# Altium integrated library Samtec 2,54 mm Pitch Socket Strips.IntLib: 489 symbols (part 2 of 4) (continued)
## SMH-104-02-G-D (continued)
SMT Horizontal Socket, -55 to 125 degC, 2.54 mm Pitch, 8-Pin, Female, RoHS; Manufacturer: Samtec; PartNumber: SMH-104-02-G-D; Pitch: 2.54 mm; DatasheetVersion: F-214; PackageVersion: AF, 2/1999; PackageReference: SMH-104-02-X-D; PackageDescription: .100 [2.54] Horizontal SMT Socket Assembly; Supplier 1: Newark; Supplier Part Number 1: 97P7854; Orientation: Horizontal; RoHS: True; Temperature Range: -55 to 125 degC; Mounting Technology: Surface Mount; ComponentLink1Description: Manufacturer URL; ComponentLink1URL: http://www.samtec.com; ComponentLink2Description: Datasheet; ComponentLink2URL: http://www.samtec.com/documents/webfiles/pdf/SMH.PDF; ComponentLink3Description: Package Specification; ComponentLink3URL: http://www.samtec.com/documents/webfiles/cpdf/SMH-1XX-XX-XX-X-XX-MKT.pdf
footprint SMTC-SMH-104-02-X-D (Horizontal SMT Socket Assembly, 2x4 Pins, 2.54mm Pitch, Female)
pins: 1, 2, 3, 4, 5, 6, 7, 8

## SMH-104-02-L-D
designator J?
SMT Horizontal Socket, -55 to 125 degC, 2.54 mm Pitch, 8-Pin, Female, RoHS; Manufacturer: Samtec; PartNumber: SMH-104-02-L-D; Pitch: 2.54 mm; DatasheetVersion: F-214; PackageVersion: AF, 2/1999; PackageReference: SMH-104-02-X-D; PackageDescription: .100 [2.54] Horizontal SMT Socket Assembly; Orientation: Horizontal; RoHS: True; Temperature Range: -55 to 125 degC; Mounting Technology: Surface Mount; ComponentLink1Description: Manufacturer URL; ComponentLink1URL: http://www.samtec.com; ComponentLink2Description: Datasheet; ComponentLink2URL: http://www.samtec.com/documents/webfiles/pdf/SMH.PDF; ComponentLink3Description: Package Specification; ComponentLink3URL: http://www.samtec.com/documents/webfiles/cpdf/SMH-1XX-XX-XX-X-XX-MKT.pdf
footprint SMTC-SMH-104-02-X-D (Horizontal SMT Socket Assembly, 2x4 Pins, 2.54mm Pitch, Female)
pins: 1, 2, 3, 4, 5, 6, 7, 8

## SMH-104-02-T-D
designator J?
SMT Horizontal Socket, -55 to 105 degC, 2.54 mm Pitch, 8-Pin, Female, RoHS; Manufacturer: Samtec; PartNumber: SMH-104-02-T-D; Pitch: 2.54 mm; DatasheetVersion: F-214; PackageVersion: AF, 2/1999; PackageReference: SMH-104-02-X-D; PackageDescription: .100 [2.54] Horizontal SMT Socket Assembly; Supplier 1: Newark; Supplier Part Number 1: 97P7867; Orientation: Horizontal; RoHS: True; Temperature Range: -55 to 105 degC; Mounting Technology: Surface Mount; ComponentLink1Description: Manufacturer URL; ComponentLink1URL: http://www.samtec.com; ComponentLink2Description: Datasheet; ComponentLink2URL: http://www.samtec.com/documents/webfiles/pdf/SMH.PDF; ComponentLink3Description: Package Specification; ComponentLink3URL: http://www.samtec.com/documents/webfiles/cpdf/SMH-1XX-XX-XX-X-XX-MKT.pdf
footprint SMTC-SMH-104-02-X-D (Horizontal SMT Socket Assembly, 2x4 Pins, 2.54mm Pitch, Female)
pins: 1, 2, 3, 4, 5, 6, 7, 8

## SMH-105-02-G-D
designator J?
SMT Horizontal Socket, -55 to 125 degC, 2.54 mm Pitch, 10-Pin, Female, RoHS; Manufacturer: Samtec; PartNumber: SMH-105-02-G-D; Pitch: 2.54 mm; DatasheetVersion: F-214; PackageVersion: AF, 2/1999; PackageReference: SMH-105-02-X-D; PackageDescription: .100 [2.54] Horizontal SMT Socket Assembly; Supplier 1: Newark; Supplier Part Number 1: 97P7877; Orientation: Horizontal; RoHS: True; Temperature Range: -55 to 125 degC; Mounting Technology: Surface Mount; ComponentLink1Description: Manufacturer URL; ComponentLink1URL: http://www.samtec.com; ComponentLink2Description: Datasheet; ComponentLink2URL: http://www.samtec.com/documents/webfiles/pdf/SMH.PDF; ComponentLink3Description: Package Specification; ComponentLink3URL: http://www.samtec.com/documents/webfiles/cpdf/SMH-1XX-XX-XX-X-XX-MKT.pdf
footprint SMTC-SMH-105-02-X-D (Horizontal SMT Socket Assembly, 2x5 Pins, 2.54mm Pitch, Female)
pins: 1, 2, 3, 4, 5, 6, 7, 8, 9, 10

## SMH-105-02-G-D-01
designator J?
SMT Horizontal Socket, -55 to 125 degC, 2.54 mm Pitch, 10-Pin, Female, RoHS; Manufacturer: Samtec; PartNumber: SMH-105-02-G-D-01; Pitch: 2.54 mm; DatasheetVersion: F-214; PackageVersion: AF, 2/1999; PackageReference: SMH-105-02-X-D-01; PackageDescription: .100 [2.54] Horizontal SMT Socket Assembly; Orientation: Horizontal; RoHS: True; Temperature Range: -55 to 125 degC; Mounting Technology: Surface Mount; ComponentLink1Description: Manufacturer URL; ComponentLink1URL: http://www.samtec.com; ComponentLink2Description: Datasheet; ComponentLink2URL: http://www.samtec.com/documents/webfiles/pdf/SMH.PDF; ComponentLink3Description: Package Specification; ComponentLink3URL: http://www.samtec.com/documents/webfiles/cpdf/SMH-1XX-XX-XX-X-XX-MKT.pdf
footprint SMTC-SMH-105-02-X-D-01 (Horizontal SMT Socket Assembly, 2x5 Pins, 2.54mm Pitch, Female)
pins: 1, 2, 3, 4, 5, 6, 7, 8, 9, 10

## SMH-105-02-G-D-BASIC
designator J?
SMT Horizontal Socket, -55 to 125 degC, 2.54 mm Pitch, 10-Pin, Female, RoHS; Manufacturer: Samtec; PartNumber: SMH-105-02-G-D-BASIC; Pitch: 2.54 mm; DatasheetVersion: F-214; PackageVersion: AF, 2/1999; PackageReference: SMH-105-02-X-D-BASIC; PackageDescription: .100 [2.54] Horizontal SMT Socket Assembly; Orientation: Horizontal; RoHS: True; Temperature Range: -55 to 125 degC; Mounting Technology: Surface Mount; ComponentLink1Description: Manufacturer URL; ComponentLink1URL: http://www.samtec.com; ComponentLink2Description: Datasheet; ComponentLink2URL: http://www.samtec.com/documents/webfiles/pdf/SMH.PDF; ComponentLink3Description: Package Specification; ComponentLink3URL: http://www.samtec.com/documents/webfiles/cpdf/SMH-1XX-XX-XX-X-XX-MKT.pdf
footprint SMTC-SMH-105-02-X-D-BASIC (Horizontal SMT Socket Assembly, 2x5 Pins, 2.54mm Pitch, Female)
pins: 1, 2, 3, 4, 5, 6, 7, 8, 9, 10

## SMH-105-02-G-S
designator J?
SMT Horizontal Socket, -55 to 125 degC, 2.54 mm Pitch, 5-Pin, Female, RoHS; Manufacturer: Samtec; PartNumber: SMH-105-02-G-S; Pitch: 2.54 mm; DatasheetVersion: F-214; PackageVersion: AF, 2/1999; PackageReference: SMH-105-02-X-S; PackageDescription: .100 [2.54] Horizontal SMT Socket Assembly; Supplier 1: Newark; Supplier Part Number 1: 97P7883; Orientation: Horizontal; RoHS: True; Temperature Range: -55 to 125 degC; Mounting Technology: Surface Mount; ComponentLink1Description: Manufacturer URL; ComponentLink1URL: http://www.samtec.com; ComponentLink2Description: Datasheet; ComponentLink2URL: http://www.samtec.com/documents/webfiles/pdf/SMH.PDF; ComponentLink3Description: Package Specification; ComponentLink3URL: http://www.samtec.com/documents/webfiles/cpdf/SMH-1XX-XX-XX-X-XX-MKT.pdf
footprint SMTC-SMH-105-02-X-S (Horizontal SMT Socket Assembly, 1x5 Pins, 2.54mm Pitch, Female)
pins: 1, 2, 3, 4, 5

## SMH-105-02-L-D
designator J?
SMT Horizontal Socket, -55 to 125 degC, 2.54 mm Pitch, 10-Pin, Female, RoHS; Manufacturer: Samtec; PartNumber: SMH-105-02-L-D; Pitch: 2.54 mm; DatasheetVersion: F-214; PackageVersion: AF, 2/1999; PackageReference: SMH-105-02-X-D; PackageDescription: .100 [2.54] Horizontal SMT Socket Assembly; Supplier 1: Newark; Supplier Part Number 1: 85T6353; Orientation: Horizontal; RoHS: True; Temperature Range: -55 to 125 degC; Mounting Technology: Surface Mount; ComponentLink1Description: Manufacturer URL; ComponentLink1URL: http://www.samtec.com; ComponentLink2Description: Datasheet; ComponentLink2URL: http://www.samtec.com/documents/webfiles/pdf/SMH.PDF; ComponentLink3Description: Package Specification; ComponentLink3URL: http://www.samtec.com/documents/webfiles/cpdf/SMH-1XX-XX-XX-X-XX-MKT.pdf
footprint SMTC-SMH-105-02-X-D (Horizontal SMT Socket Assembly, 2x5 Pins, 2.54mm Pitch, Female)
pins: 1, 2, 3, 4, 5, 6, 7, 8, 9, 10

## SMH-105-02-L-D-01
designator J?
SMT Horizontal Socket, -55 to 125 degC, 2.54 mm Pitch, 10-Pin, Female, RoHS; Manufacturer: Samtec; PartNumber: SMH-105-02-L-D-01; Pitch: 2.54 mm; DatasheetVersion: F-214; PackageVersion: AF, 2/1999; PackageReference: SMH-105-02-X-D-01; PackageDescription: .100 [2.54] Horizontal SMT Socket Assembly; Orientation: Horizontal; RoHS: True; Temperature Range: -55 to 125 degC; Mounting Technology: Surface Mount; ComponentLink1Description: Manufacturer URL; ComponentLink1URL: http://www.samtec.com; ComponentLink2Description: Datasheet; ComponentLink2URL: http://www.samtec.com/documents/webfiles/pdf/SMH.PDF; ComponentLink3Description: Package Specification; ComponentLink3URL: http://www.samtec.com/documents/webfiles/cpdf/SMH-1XX-XX-XX-X-XX-MKT.pdf
footprint SMTC-SMH-105-02-X-D-01 (Horizontal SMT Socket Assembly, 2x5 Pins, 2.54mm Pitch, Female)
pins: 1, 2, 3, 4, 5, 6, 7, 8, 9, 10

## SMH-105-02-L-D-BASIC
designator J?
SMT Horizontal Socket, -55 to 125 degC, 2.54 mm Pitch, 10-Pin, Female, RoHS; Manufacturer: Samtec; PartNumber: SMH-105-02-L-D-BASIC; Pitch: 2.54 mm; DatasheetVersion: F-214; PackageVersion: AF, 2/1999; PackageReference: SMH-105-02-X-D-BASIC; PackageDescription: .100 [2.54] Horizontal SMT Socket Assembly; Orientation: Horizontal; RoHS: True; Temperature Range: -55 to 125 degC; Mounting Technology: Surface Mount; ComponentLink1Description: Manufacturer URL; ComponentLink1URL: http://www.samtec.com; ComponentLink2Description: Datasheet; ComponentLink2URL: http://www.samtec.com/documents/webfiles/pdf/SMH.PDF; ComponentLink3Description: Package Specification; ComponentLink3URL: http://www.samtec.com/documents/webfiles/cpdf/SMH-1XX-XX-XX-X-XX-MKT.pdf
footprint SMTC-SMH-105-02-X-D-BASIC (Horizontal SMT Socket Assembly, 2x5 Pins, 2.54mm Pitch, Female)
pins: 1, 2, 3, 4, 5, 6, 7, 8, 9, 10

## SMH-105-02-L-S
designator J?
SMT Horizontal Socket, -55 to 125 degC, 2.54 mm Pitch, 5-Pin, Female, RoHS; Manufacturer: Samtec; PartNumber: SMH-105-02-L-S; Pitch: 2.54 mm; DatasheetVersion: F-214; PackageVersion: AF, 2/1999; PackageReference: SMH-105-02-X-S; PackageDescription: .100 [2.54] Horizontal SMT Socket Assembly; Supplier 1: Newark; Supplier Part Number 1: 85T6354; Orientation: Horizontal; RoHS: True; Temperature Range: -55 to 125 degC; Mounting Technology: Surface Mount; ComponentLink1Description: Manufacturer URL; ComponentLink1URL: http://www.samtec.com; ComponentLink2Description: Datasheet; ComponentLink2URL: http://www.samtec.com/documents/webfiles/pdf/SMH.PDF; ComponentLink3Description: Package Specification; ComponentLink3URL: http://www.samtec.com/documents/webfiles/cpdf/SMH-1XX-XX-XX-X-XX-MKT.pdf
footprint SMTC-SMH-105-02-X-S (Horizontal SMT Socket Assembly, 1x5 Pins, 2.54mm Pitch, Female)
pins: 1, 2, 3, 4, 5

## SMH-105-02-T-D
designator J?
SMT Horizontal Socket, -55 to 105 degC, 2.54 mm Pitch, 10-Pin, Female, RoHS; Manufacturer: Samtec; PartNumber: SMH-105-02-T-D; Pitch: 2.54 mm; DatasheetVersion: F-214; PackageVersion: AF, 2/1999; PackageReference: SMH-105-02-X-D; PackageDescription: .100 [2.54] Horizontal SMT Socket Assembly; Supplier 1: Newark; Supplier Part Number 1: 97P7897; Orientation: Horizontal; RoHS: True; Temperature Range: -55 to 105 degC; Mounting Technology: Surface Mount; ComponentLink1Description: Manufacturer URL; ComponentLink1URL: http://www.samtec.com; ComponentLink2Description: Datasheet; ComponentLink2URL: http://www.samtec.com/documents/webfiles/pdf/SMH.PDF; ComponentLink3Description: Package Specification; ComponentLink3URL: http://www.samtec.com/documents/webfiles/cpdf/SMH-1XX-XX-XX-X-XX-MKT.pdf
footprint SMTC-SMH-105-02-X-D (Horizontal SMT Socket Assembly, 2x5 Pins, 2.54mm Pitch, Female)
pins: 1, 2, 3, 4, 5, 6, 7, 8, 9, 10

## SMH-105-02-T-D-01
designator J?
SMT Horizontal Socket, -55 to 105 degC, 2.54 mm Pitch, 10-Pin, Female, RoHS; Manufacturer: Samtec; PartNumber: SMH-105-02-T-D-01; Pitch: 2.54 mm; DatasheetVersion: F-214; PackageVersion: AF, 2/1999; PackageReference: SMH-105-02-X-D-01; PackageDescription: .100 [2.54] Horizontal SMT Socket Assembly; Orientation: Horizontal; RoHS: True; Temperature Range: -55 to 105 degC; Mounting Technology: Surface Mount; ComponentLink1Description: Manufacturer URL; ComponentLink1URL: http://www.samtec.com; ComponentLink2Description: Datasheet; ComponentLink2URL: http://www.samtec.com/documents/webfiles/pdf/SMH.PDF; ComponentLink3Description: Package Specification; ComponentLink3URL: http://www.samtec.com/documents/webfiles/cpdf/SMH-1XX-XX-XX-X-XX-MKT.pdf
footprint SMTC-SMH-105-02-X-D-01 (Horizontal SMT Socket Assembly, 2x5 Pins, 2.54mm Pitch, Female)
pins: 1, 2, 3, 4, 5, 6, 7, 8, 9, 10

## SMH-105-02-T-D-BASIC
designator J?
SMT Horizontal Socket, -55 to 105 degC, 2.54 mm Pitch, 10-Pin, Female, RoHS; Manufacturer: Samtec; PartNumber: SMH-105-02-T-D-BASIC; Pitch: 2.54 mm; DatasheetVersion: F-214; PackageVersion: AF, 2/1999; PackageReference: SMH-105-02-X-D-BASIC; PackageDescription: .100 [2.54] Horizontal SMT Socket Assembly; Orientation: Horizontal; RoHS: True; Temperature Range: -55 to 105 degC; Mounting Technology: Surface Mount; ComponentLink1Description: Manufacturer URL; ComponentLink1URL: http://www.samtec.com; ComponentLink2Description: Datasheet; ComponentLink2URL: http://www.samtec.com/documents/webfiles/pdf/SMH.PDF; ComponentLink3Description: Package Specification; ComponentLink3URL: http://www.samtec.com/documents/webfiles/cpdf/SMH-1XX-XX-XX-X-XX-MKT.pdf
footprint SMTC-SMH-105-02-X-D-BASIC (Horizontal SMT Socket Assembly, 2x5 Pins, 2.54mm Pitch, Female)
pins: 1, 2, 3, 4, 5, 6, 7, 8, 9, 10

## SMH-105-02-T-S
designator J?
SMT Horizontal Socket, -55 to 105 degC, 2.54 mm Pitch, 5-Pin, Female, RoHS; Manufacturer: Samtec; PartNumber: SMH-105-02-T-S; Pitch: 2.54 mm; DatasheetVersion: F-214; PackageVersion: AF, 2/1999; PackageReference: SMH-105-02-X-S; PackageDescription: .100 [2.54] Horizontal SMT Socket Assembly; Supplier 1: Newark; Supplier Part Number 1: 97P7901; Orientation: Horizontal; RoHS: True; Temperature Range: -55 to 105 degC; Mounting Technology: Surface Mount; ComponentLink1Description: Manufacturer URL; ComponentLink1URL: http://www.samtec.com; ComponentLink2Description: Datasheet; ComponentLink2URL: http://www.samtec.com/documents/webfiles/pdf/SMH.PDF; ComponentLink3Description: Package Specification; ComponentLink3URL: http://www.samtec.com/documents/webfiles/cpdf/SMH-1XX-XX-XX-X-XX-MKT.pdf
footprint SMTC-SMH-105-02-X-S (Horizontal SMT Socket Assembly, 1x5 Pins, 2.54mm Pitch, Female)
pins: 1, 2, 3, 4, 5

## SMH-107-02-G-D
designator J?
SMT Horizontal Socket, -55 to 125 degC, 2.54 mm Pitch, 14-Pin, Female, RoHS; Manufacturer: Samtec; PartNumber: SMH-107-02-G-D; Pitch: 2.54 mm; DatasheetVersion: F-214; PackageVersion: AF, 2/1999; PackageReference: SMH-107-02-X-D; PackageDescription: .100 [2.54] Horizontal SMT Socket Assembly; Supplier 1: Newark; Supplier Part Number 1: 97P7924; Orientation: Horizontal; RoHS: True; Temperature Range: -55 to 125 degC; Mounting Technology: Surface Mount; ComponentLink1Description: Manufacturer URL; ComponentLink1URL: http://www.samtec.com; ComponentLink2Description: Datasheet; ComponentLink2URL: http://www.samtec.com/documents/webfiles/pdf/SMH.PDF; ComponentLink3Description: Package Specification; ComponentLink3URL: http://www.samtec.com/documents/webfiles/cpdf/SMH-1XX-XX-XX-X-XX-MKT.pdf
footprint SMTC-SMH-107-02-X-D (Horizontal SMT Socket Assembly, 2x7 Pins, 2.54mm Pitch, Female)
pins: 1, 2, 3, 4, 5, 6, 7, 8, 9, 10, 11, 12, 13, 14

## SMH-107-02-L-D
designator J?
SMT Horizontal Socket, -55 to 125 degC, 2.54 mm Pitch, 14-Pin, Female, RoHS; Manufacturer: Samtec; PartNumber: SMH-107-02-L-D; Pitch: 2.54 mm; DatasheetVersion: F-214; PackageVersion: AF, 2/1999; PackageReference: SMH-107-02-X-D; PackageDescription: .100 [2.54] Horizontal SMT Socket Assembly; Supplier 1: Newark; Supplier Part Number 1: 85T6357; Orientation: Horizontal; RoHS: True; Temperature Range: -55 to 125 degC; Mounting Technology: Surface Mount; ComponentLink1Description: Manufacturer URL; ComponentLink1URL: http://www.samtec.com; ComponentLink2Description: Datasheet; ComponentLink2URL: http://www.samtec.com/documents/webfiles/pdf/SMH.PDF; ComponentLink3Description: Package Specification; ComponentLink3URL: http://www.samtec.com/documents/webfiles/cpdf/SMH-1XX-XX-XX-X-XX-MKT.pdf
footprint SMTC-SMH-107-02-X-D (Horizontal SMT Socket Assembly, 2x7 Pins, 2.54mm Pitch, Female)
pins: 1, 2, 3, 4, 5, 6, 7, 8, 9, 10, 11, 12, 13, 14

## SMH-107-02-T-D
designator J?
SMT Horizontal Socket, -55 to 105 degC, 2.54 mm Pitch, 14-Pin, Female, RoHS; Manufacturer: Samtec; PartNumber: SMH-107-02-T-D; Pitch: 2.54 mm; DatasheetVersion: F-214; PackageVersion: AF, 2/1999; PackageReference: SMH-107-02-X-D; PackageDescription: .100 [2.54] Horizontal SMT Socket Assembly; Supplier 1: Newark; Supplier Part Number 1: 97P7941; Orientation: Horizontal; RoHS: True; Temperature Range: -55 to 105 degC; Mounting Technology: Surface Mount; ComponentLink1Description: Manufacturer URL; ComponentLink1URL: http://www.samtec.com; ComponentLink2Description: Datasheet; ComponentLink2URL: http://www.samtec.com/documents/webfiles/pdf/SMH.PDF; ComponentLink3Description: Package Specification; ComponentLink3URL: http://www.samtec.com/documents/webfiles/cpdf/SMH-1XX-XX-XX-X-XX-MKT.pdf
footprint SMTC-SMH-107-02-X-D (Horizontal SMT Socket Assembly, 2x7 Pins, 2.54mm Pitch, Female)
pins: 1, 2, 3, 4, 5, 6, 7, 8, 9, 10, 11, 12, 13, 14

## SMH-108-02-G-D
designator J?
SMT Horizontal Socket, -55 to 125 degC, 2.54 mm Pitch, 16-Pin, Female, RoHS; Manufacturer: Samtec; PartNumber: SMH-108-02-G-D; Pitch: 2.54 mm; DatasheetVersion: F-214; PackageVersion: AF, 2/1999; PackageReference: SMH-108-02-X-D; PackageDescription: .100 [2.54] Horizontal SMT Socket Assembly; Supplier 1: Newark; Supplier Part Number 1: 97P7950; Orientation: Horizontal; RoHS: True; Temperature Range: -55 to 125 degC; Mounting Technology: Surface Mount; ComponentLink1Description: Manufacturer URL; ComponentLink1URL: http://www.samtec.com; ComponentLink2Description: Datasheet; ComponentLink2URL: http://www.samtec.com/documents/webfiles/pdf/SMH.PDF; ComponentLink3Description: Package Specification; ComponentLink3URL: http://www.samtec.com/documents/webfiles/cpdf/SMH-1XX-XX-XX-X-XX-MKT.pdf
footprint SMTC-SMH-108-02-X-D (Horizontal SMT Socket Assembly, 2x8 Pins, 2.54mm Pitch, Female)
pins: 1, 2, 3, 4, 5, 6, 7, 8, 9, 10, 11, 12, 13, 14, 15, 16

## SMH-108-02-G-S
designator J?
SMT Horizontal Socket, -55 to 125 degC, 2.54 mm Pitch, 8-Pin, Female, RoHS; Manufacturer: Samtec; PartNumber: SMH-108-02-G-S; Pitch: 2.54 mm; DatasheetVersion: F-214; PackageVersion: AF, 2/1999; PackageReference: SMH-108-02-X-S; PackageDescription: .100 [2.54] Horizontal SMT Socket Assembly; Supplier 1: Newark; Supplier Part Number 1: 97P7952; Orientation: Horizontal; RoHS: True; Temperature Range: -55 to 125 degC; Mounting Technology: Surface Mount; ComponentLink1Description: Manufacturer URL; ComponentLink1URL: http://www.samtec.com; ComponentLink2Description: Datasheet; ComponentLink2URL: http://www.samtec.com/documents/webfiles/pdf/SMH.PDF; ComponentLink3Description: Package Specification; ComponentLink3URL: http://www.samtec.com/documents/webfiles/cpdf/SMH-1XX-XX-XX-X-XX-MKT.pdf
footprint SMTC-SMH-108-02-X-S (Horizontal SMT Socket Assembly, 1x8 Pins, 2.54mm Pitch, Female)
pins: 1, 2, 3, 4, 5, 6, 7, 8

## SMH-108-02-L-D
designator J?
SMT Horizontal Socket, -55 to 125 degC, 2.54 mm Pitch, 16-Pin, Female, RoHS; Manufacturer: Samtec; PartNumber: SMH-108-02-L-D; Pitch: 2.54 mm; DatasheetVersion: F-214; PackageVersion: AF, 2/1999; PackageReference: SMH-108-02-X-D; PackageDescription: .100 [2.54] Horizontal SMT Socket Assembly; Supplier 1: Newark; Supplier Part Number 1: 85T6359; Orientation: Horizontal; RoHS: True; Temperature Range: -55 to 125 degC; Mounting Technology: Surface Mount; ComponentLink1Description: Manufacturer URL; ComponentLink1URL: http://www.samtec.com; ComponentLink2Description: Datasheet; ComponentLink2URL: http://www.samtec.com/documents/webfiles/pdf/SMH.PDF; ComponentLink3Description: Package Specification; ComponentLink3URL: http://www.samtec.com/documents/webfiles/cpdf/SMH-1XX-XX-XX-X-XX-MKT.pdf
footprint SMTC-SMH-108-02-X-D (Horizontal SMT Socket Assembly, 2x8 Pins, 2.54mm Pitch, Female)
pins: 1, 2, 3, 4, 5, 6, 7, 8, 9, 10, 11, 12, 13, 14, 15, 16

## SMH-108-02-L-S
designator J?
SMT Horizontal Socket, -55 to 125 degC, 2.54 mm Pitch, 8-Pin, Female, RoHS; Manufacturer: Samtec; PartNumber: SMH-108-02-L-S; Pitch: 2.54 mm; DatasheetVersion: F-214; PackageVersion: AF, 2/1999; PackageReference: SMH-108-02-X-S; PackageDescription: .100 [2.54] Horizontal SMT Socket Assembly; Supplier 1: Newark; Supplier Part Number 1: 12T2514; Orientation: Horizontal; RoHS: True; Temperature Range: -55 to 125 degC; Mounting Technology: Surface Mount; ComponentLink1Description: Manufacturer URL; ComponentLink1URL: http://www.samtec.com; ComponentLink2Description: Datasheet; ComponentLink2URL: http://www.samtec.com/documents/webfiles/pdf/SMH.PDF; ComponentLink3Description: Package Specification; ComponentLink3URL: http://www.samtec.com/documents/webfiles/cpdf/SMH-1XX-XX-XX-X-XX-MKT.pdf
footprint SMTC-SMH-108-02-X-S (Horizontal SMT Socket Assembly, 1x8 Pins, 2.54mm Pitch, Female)
pins: 1, 2, 3, 4, 5, 6, 7, 8

## SMH-108-02-T-D
designator J?
SMT Horizontal Socket, -55 to 105 degC, 2.54 mm Pitch, 16-Pin, Female, RoHS; Manufacturer: Samtec; PartNumber: SMH-108-02-T-D; Pitch: 2.54 mm; DatasheetVersion: F-214; PackageVersion: AF, 2/1999; PackageReference: SMH-108-02-X-D; PackageDescription: .100 [2.54] Horizontal SMT Socket Assembly; Supplier 1: Newark; Supplier Part Number 1: 97P7964; Orientation: Horizontal; RoHS: True; Temperature Range: -55 to 105 degC; Mounting Technology: Surface Mount; ComponentLink1Description: Manufacturer URL; ComponentLink1URL: http://www.samtec.com; ComponentLink2Description: Datasheet; ComponentLink2URL: http://www.samtec.com/documents/webfiles/pdf/SMH.PDF; ComponentLink3Description: Package Specification; ComponentLink3URL: http://www.samtec.com/documents/webfiles/cpdf/SMH-1XX-XX-XX-X-XX-MKT.pdf
footprint SMTC-SMH-108-02-X-D (Horizontal SMT Socket Assembly, 2x8 Pins, 2.54mm Pitch, Female)
pins: 1, 2, 3, 4, 5, 6, 7, 8, 9, 10, 11, 12, 13, 14, 15, 16

## SMH-108-02-T-S
designator J?
SMT Horizontal Socket, -55 to 105 degC, 2.54 mm Pitch, 8-Pin, Female, RoHS; Manufacturer: Samtec; PartNumber: SMH-108-02-T-S; Pitch: 2.54 mm; DatasheetVersion: F-214; PackageVersion: AF, 2/1999; PackageReference: SMH-108-02-X-S; PackageDescription: .100 [2.54] Horizontal SMT Socket Assembly; Supplier 1: Newark; Supplier Part Number 1: 97P7966; Orientation: Horizontal; RoHS: True; Temperature Range: -55 to 105 degC; Mounting Technology: Surface Mount; ComponentLink1Description: Manufacturer URL; ComponentLink1URL: http://www.samtec.com; ComponentLink2Description: Datasheet; ComponentLink2URL: http://www.samtec.com/documents/webfiles/pdf/SMH.PDF; ComponentLink3Description: Package Specification; ComponentLink3URL: http://www.samtec.com/documents/webfiles/cpdf/SMH-1XX-XX-XX-X-XX-MKT.pdf
footprint SMTC-SMH-108-02-X-S (Horizontal SMT Socket Assembly, 1x8 Pins, 2.54mm Pitch, Female)
pins: 1, 2, 3, 4, 5, 6, 7, 8

## SMH-110-02-G-S
designator J?
SMT Horizontal Socket, -55 to 125 degC, 2.54 mm Pitch, 10-Pin, Female, RoHS; Manufacturer: Samtec; PartNumber: SMH-110-02-G-S; Pitch: 2.54 mm; DatasheetVersion: F-214; PackageVersion: AF, 2/1999; PackageReference: SMH-110-02-X-S; PackageDescription: .100 [2.54] Horizontal SMT Socket Assembly; Supplier 1: Newark; Supplier Part Number 1: 97P7997; Orientation: Horizontal; RoHS: True; Temperature Range: -55 to 125 degC; Mounting Technology: Surface Mount; ComponentLink1Description: Manufacturer URL; ComponentLink1URL: http://www.samtec.com; ComponentLink2Description: Datasheet; ComponentLink2URL: http://www.samtec.com/documents/webfiles/pdf/SMH.PDF; ComponentLink3Description: Package Specification; ComponentLink3URL: http://www.samtec.com/documents/webfiles/cpdf/SMH-1XX-XX-XX-X-XX-MKT.pdf
footprint SMTC-SMH-110-02-X-S (Horizontal SMT Socket Assembly, 1x10 Pins, 2.54mm Pitch, Female)
pins: 1, 2, 3, 4, 5, 6, 7, 8, 9, 10

## SMH-110-02-L-S
designator J?
SMT Horizontal Socket, -55 to 125 degC, 2.54 mm Pitch, 10-Pin, Female, RoHS; Manufacturer: Samtec; PartNumber: SMH-110-02-L-S; Pitch: 2.54 mm; DatasheetVersion: F-214; PackageVersion: AF, 2/1999; PackageReference: SMH-110-02-X-S; PackageDescription: .100 [2.54] Horizontal SMT Socket Assembly; Supplier 1: Newark; Supplier Part Number 1: 85T6362; Orientation: Horizontal; RoHS: True; Temperature Range: -55 to 125 degC; Mounting Technology: Surface Mount; ComponentLink1Description: Manufacturer URL; ComponentLink1URL: http://www.samtec.com; ComponentLink2Description: Datasheet; ComponentLink2URL: http://www.samtec.com/documents/webfiles/pdf/SMH.PDF; ComponentLink3Description: Package Specification; ComponentLink3URL: http://www.samtec.com/documents/webfiles/cpdf/SMH-1XX-XX-XX-X-XX-MKT.pdf
footprint SMTC-SMH-110-02-X-S (Horizontal SMT Socket Assembly, 1x10 Pins, 2.54mm Pitch, Female)
pins: 1, 2, 3, 4, 5, 6, 7, 8, 9, 10

## SMH-110-02-T-S
designator J?
SMT Horizontal Socket, -55 to 105 degC, 2.54 mm Pitch, 10-Pin, Female, RoHS; Manufacturer: Samtec; PartNumber: SMH-110-02-T-S; Pitch: 2.54 mm; DatasheetVersion: F-214; PackageVersion: AF, 2/1999; PackageReference: SMH-110-02-X-S; PackageDescription: .100 [2.54] Horizontal SMT Socket Assembly; Supplier 1: Newark; Supplier Part Number 1: 97P8011; Orientation: Horizontal; RoHS: True; Temperature Range: -55 to 105 degC; Mounting Technology: Surface Mount; ComponentLink1Description: Manufacturer URL; ComponentLink1URL: http://www.samtec.com; ComponentLink2Description: Datasheet; ComponentLink2URL: http://www.samtec.com/documents/webfiles/pdf/SMH.PDF; ComponentLink3Description: Package Specification; ComponentLink3URL: http://www.samtec.com/documents/webfiles/cpdf/SMH-1XX-XX-XX-X-XX-MKT.pdf
footprint SMTC-SMH-110-02-X-S (Horizontal SMT Socket Assembly, 1x10 Pins, 2.54mm Pitch, Female)
pins: 1, 2, 3, 4, 5, 6, 7, 8, 9, 10

## SMH-117-02-G-D
designator J?
SMT Horizontal Socket, -55 to 125 degC, 2.54 mm Pitch, 34-Pin, Female, RoHS; Manufacturer: Samtec; PartNumber: SMH-117-02-G-D; Pitch: 2.54 mm; DatasheetVersion: F-214; PackageVersion: AF, 2/1999; PackageReference: SMH-117-02-X-D; PackageDescription: .100 [2.54] Horizontal SMT Socket Assembly; Supplier 1: Newark; Supplier Part Number 1: 97P8094; Orientation: Horizontal; RoHS: True; Temperature Range: -55 to 125 degC; Mounting Technology: Surface Mount; ComponentLink1Description: Manufacturer URL; ComponentLink1URL: http://www.samtec.com; ComponentLink2Description: Datasheet; ComponentLink2URL: http://www.samtec.com/documents/webfiles/pdf/SMH.PDF; ComponentLink3Description: Package Specification; ComponentLink3URL: http://www.samtec.com/documents/webfiles/cpdf/SMH-1XX-XX-XX-X-XX-MKT.pdf
footprint SMTC-SMH-117-02-X-D (Horizontal SMT Socket Assembly, 2x17 Pins, 2.54mm Pitch, Female)
pins: 1, 2, 3, 4, 5, 6, 7, 8, 9, 10, 11, 12, 13, 14, 15, 16, 17, 18, 19, 20, 21, 22, 23, 24, 25, 26, 27, 28, 29, 30, 31, 32, 33, 34

## SMH-117-02-L-D
designator J?
SMT Horizontal Socket, -55 to 125 degC, 2.54 mm Pitch, 34-Pin, Female, RoHS; Manufacturer: Samtec; PartNumber: SMH-117-02-L-D; Pitch: 2.54 mm; DatasheetVersion: F-214; PackageVersion: AF, 2/1999; PackageReference: SMH-117-02-X-D; PackageDescription: .100 [2.54] Horizontal SMT Socket Assembly; Supplier 1: Newark; Supplier Part Number 1: 85T6368; Orientation: Horizontal; RoHS: True; Temperature Range: -55 to 125 degC; Mounting Technology: Surface Mount; ComponentLink1Description: Manufacturer URL; ComponentLink1URL: http://www.samtec.com; ComponentLink2Description: Datasheet; ComponentLink2URL: http://www.samtec.com/documents/webfiles/pdf/SMH.PDF; ComponentLink3Description: Package Specification; ComponentLink3URL: http://www.samtec.com/documents/webfiles/cpdf/SMH-1XX-XX-XX-X-XX-MKT.pdf
footprint SMTC-SMH-117-02-X-D (Horizontal SMT Socket Assembly, 2x17 Pins, 2.54mm Pitch, Female)
pins: 1, 2, 3, 4, 5, 6, 7, 8, 9, 10, 11, 12, 13, 14, 15, 16, 17, 18, 19, 20, 21, 22, 23, 24, 25, 26, 27, 28, 29, 30, 31, 32, 33, 34

## SMH-117-02-T-D
designator J?
SMT Horizontal Socket, -55 to 105 degC, 2.54 mm Pitch, 34-Pin, Female, RoHS; Manufacturer: Samtec; PartNumber: SMH-117-02-T-D; Pitch: 2.54 mm; DatasheetVersion: F-214; PackageVersion: AF, 2/1999; PackageReference: SMH-117-02-X-D; PackageDescription: .100 [2.54] Horizontal SMT Socket Assembly; Supplier 1: Newark; Supplier Part Number 1: 97P8102; Orientation: Horizontal; RoHS: True; Temperature Range: -55 to 105 degC; Mounting Technology: Surface Mount; ComponentLink1Description: Manufacturer URL; ComponentLink1URL: http://www.samtec.com; ComponentLink2Description: Datasheet; ComponentLink2URL: http://www.samtec.com/documents/webfiles/pdf/SMH.PDF; ComponentLink3Description: Package Specification; ComponentLink3URL: http://www.samtec.com/documents/webfiles/cpdf/SMH-1XX-XX-XX-X-XX-MKT.pdf
footprint SMTC-SMH-117-02-X-D (Horizontal SMT Socket Assembly, 2x17 Pins, 2.54mm Pitch, Female)
pins: 1, 2, 3, 4, 5, 6, 7, 8, 9, 10, 11, 12, 13, 14, 15, 16, 17, 18, 19, 20, 21, 22, 23, 24, 25, 26, 27, 28, 29, 30, 31, 32, 33, 34

## SMH-118-02-G-S-2
designator J?
SMT Horizontal Socket, -55 to 125 degC, 2.54 mm Pitch, 18-Pin, Female, RoHS; Manufacturer: Samtec; PartNumber: SMH-118-02-G-S-2; Pitch: 2.54 mm; DatasheetVersion: F-214; PackageVersion: AF, 2/1999; PackageReference: SMH-118-02-X-S-2; PackageDescription: .100 [2.54] Horizontal SMT Socket Assembly; Orientation: Horizontal; RoHS: True; Temperature Range: -55 to 125 degC; Mounting Technology: Surface Mount; ComponentLink1Description: Manufacturer URL; ComponentLink1URL: http://www.samtec.com; ComponentLink2Description: Datasheet; ComponentLink2URL: http://www.samtec.com/documents/webfiles/pdf/SMH.PDF; ComponentLink3Description: Package Specification; ComponentLink3URL: http://www.samtec.com/documents/webfiles/cpdf/SMH-1XX-XX-XX-X-XX-MKT.pdf
footprint SMTC-SMH-118-02-X-S-2 (Horizontal SMT Socket Assembly, 1x18 Pins, 2.54mm Pitch, Female)
pins: 1, 2, 3, 4, 5, 6, 7, 8, 9, 10, 11, 12, 13, 14, 15, 16, 17, 18

## SMH-118-02-L-S-2
designator J?
SMT Horizontal Socket, -55 to 125 degC, 2.54 mm Pitch, 18-Pin, Female, RoHS; Manufacturer: Samtec; PartNumber: SMH-118-02-L-S-2; Pitch: 2.54 mm; DatasheetVersion: F-214; PackageVersion: AF, 2/1999; PackageReference: SMH-118-02-X-S-2; PackageDescription: .100 [2.54] Horizontal SMT Socket Assembly; Orientation: Horizontal; RoHS: True; Temperature Range: -55 to 125 degC; Mounting Technology: Surface Mount; ComponentLink1Description: Manufacturer URL; ComponentLink1URL: http://www.samtec.com; ComponentLink2Description: Datasheet; ComponentLink2URL: http://www.samtec.com/documents/webfiles/pdf/SMH.PDF; ComponentLink3Description: Package Specification; ComponentLink3URL: http://www.samtec.com/documents/webfiles/cpdf/SMH-1XX-XX-XX-X-XX-MKT.pdf
footprint SMTC-SMH-118-02-X-S-2 (Horizontal SMT Socket Assembly, 1x18 Pins, 2.54mm Pitch, Female)
pins: 1, 2, 3, 4, 5, 6, 7, 8, 9, 10, 11, 12, 13, 14, 15, 16, 17, 18

## SMH-118-02-T-S-2
designator J?
SMT Horizontal Socket, -55 to 105 degC, 2.54 mm Pitch, 18-Pin, Female, RoHS; Manufacturer: Samtec; PartNumber: SMH-118-02-T-S-2; Pitch: 2.54 mm; DatasheetVersion: F-214; PackageVersion: AF, 2/1999; PackageReference: SMH-118-02-X-S-2; PackageDescription: .100 [2.54] Horizontal SMT Socket Assembly; Orientation: Horizontal; RoHS: True; Temperature Range: -55 to 105 degC; Mounting Technology: Surface Mount; ComponentLink1Description: Manufacturer URL; ComponentLink1URL: http://www.samtec.com; ComponentLink2Description: Datasheet; ComponentLink2URL: http://www.samtec.com/documents/webfiles/pdf/SMH.PDF; ComponentLink3Description: Package Specification; ComponentLink3URL: http://www.samtec.com/documents/webfiles/cpdf/SMH-1XX-XX-XX-X-XX-MKT.pdf
footprint SMTC-SMH-118-02-X-S-2 (Horizontal SMT Socket Assembly, 1x18 Pins, 2.54mm Pitch, Female)
pins: 1, 2, 3, 4, 5, 6, 7, 8, 9, 10, 11, 12, 13, 14, 15, 16, 17, 18

## SMH-122-02-G-D
designator J?
SMT Horizontal Socket, -55 to 125 degC, 2.54 mm Pitch, 44-Pin, Female, RoHS; Manufacturer: Samtec; PartNumber: SMH-122-02-G-D; Pitch: 2.54 mm; DatasheetVersion: F-214; PackageVersion: AF, 2/1999; PackageReference: SMH-122-02-X-D; PackageDescription: .100 [2.54] Horizontal SMT Socket Assembly; Orientation: Horizontal; RoHS: True; Temperature Range: -55 to 125 degC; Mounting Technology: Surface Mount; ComponentLink1Description: Manufacturer URL; ComponentLink1URL: http://www.samtec.com; ComponentLink2Description: Datasheet; ComponentLink2URL: http://www.samtec.com/documents/webfiles/pdf/SMH.PDF; ComponentLink3Description: Package Specification; ComponentLink3URL: http://www.samtec.com/documents/webfiles/cpdf/SMH-1XX-XX-XX-X-XX-MKT.pdf
footprint SMTC-SMH-122-02-X-D (Horizontal SMT Socket Assembly, 2x22 Pins, 2.54mm Pitch, Female)
pins: 1, 2, 3, 4, 5, 6, 7, 8, 9, 10, 11, 12, 13, 14, 15, 16, 17, 18, 19, 20, 21, 22, 23, 24, 25, 26, 27, 28, 29, 30, 31, 32, 33, 34, 35, 36, 37, 38, 39, 40, 41, 42, 43, 44

## SMH-122-02-L-D
designator J?
SMT Horizontal Socket, -55 to 125 degC, 2.54 mm Pitch, 44-Pin, Female, RoHS; Manufacturer: Samtec; PartNumber: SMH-122-02-L-D; Pitch: 2.54 mm; DatasheetVersion: F-214; PackageVersion: AF, 2/1999; PackageReference: SMH-122-02-X-D; PackageDescription: .100 [2.54] Horizontal SMT Socket Assembly; Orientation: Horizontal; RoHS: True; Temperature Range: -55 to 125 degC; Mounting Technology: Surface Mount; ComponentLink1Description: Manufacturer URL; ComponentLink1URL: http://www.samtec.com; ComponentLink2Description: Datasheet; ComponentLink2URL: http://www.samtec.com/documents/webfiles/pdf/SMH.PDF; ComponentLink3Description: Package Specification; ComponentLink3URL: http://www.samtec.com/documents/webfiles/cpdf/SMH-1XX-XX-XX-X-XX-MKT.pdf
footprint SMTC-SMH-122-02-X-D (Horizontal SMT Socket Assembly, 2x22 Pins, 2.54mm Pitch, Female)
pins: 1, 2, 3, 4, 5, 6, 7, 8, 9, 10, 11, 12, 13, 14, 15, 16, 17, 18, 19, 20, 21, 22, 23, 24, 25, 26, 27, 28, 29, 30, 31, 32, 33, 34, 35, 36, 37, 38, 39, 40, 41, 42, 43, 44

## SMH-122-02-T-D
designator J?
SMT Horizontal Socket, -55 to 105 degC, 2.54 mm Pitch, 44-Pin, Female, RoHS; Manufacturer: Samtec; PartNumber: SMH-122-02-T-D; Pitch: 2.54 mm; DatasheetVersion: F-214; PackageVersion: AF, 2/1999; PackageReference: SMH-122-02-X-D; PackageDescription: .100 [2.54] Horizontal SMT Socket Assembly; Orientation: Horizontal; RoHS: True; Temperature Range: -55 to 105 degC; Mounting Technology: Surface Mount; ComponentLink1Description: Manufacturer URL; ComponentLink1URL: http://www.samtec.com; ComponentLink2Description: Datasheet; ComponentLink2URL: http://www.samtec.com/documents/webfiles/pdf/SMH.PDF; ComponentLink3Description: Package Specification; ComponentLink3URL: http://www.samtec.com/documents/webfiles/cpdf/SMH-1XX-XX-XX-X-XX-MKT.pdf
footprint SMTC-SMH-122-02-X-D (Horizontal SMT Socket Assembly, 2x22 Pins, 2.54mm Pitch, Female)
pins: 1, 2, 3, 4, 5, 6, 7, 8, 9, 10, 11, 12, 13, 14, 15, 16, 17, 18, 19, 20, 21, 22, 23, 24, 25, 26, 27, 28, 29, 30, 31, 32, 33, 34, 35, 36, 37, 38, 39, 40, 41, 42, 43, 44

## SMH-125-02-G-D
designator J?
SMT Horizontal Socket, -55 to 125 degC, 2.54 mm Pitch, 50-Pin, Female, RoHS; Manufacturer: Samtec; PartNumber: SMH-125-02-G-D; Pitch: 2.54 mm; DatasheetVersion: F-214; PackageVersion: AF, 2/1999; PackageReference: SMH-125-02-X-D; PackageDescription: .100 [2.54] Horizontal SMT Socket Assembly; Supplier 1: Newark; Supplier Part Number 1: 97P8154; Orientation: Horizontal; RoHS: True; Temperature Range: -55 to 125 degC; Mounting Technology: Surface Mount; ComponentLink1Description: Manufacturer URL; ComponentLink1URL: http://www.samtec.com; ComponentLink2Description: Datasheet; ComponentLink2URL: http://www.samtec.com/documents/webfiles/pdf/SMH.PDF; ComponentLink3Description: Package Specification; ComponentLink3URL: http://www.samtec.com/documents/webfiles/cpdf/SMH-1XX-XX-XX-X-XX-MKT.pdf
footprint SMTC-SMH-125-02-X-D (Horizontal SMT Socket Assembly, 2x25 Pins, 2.54mm Pitch, Female)
pins: 1, 2, 3, 4, 5, 6, 7, 8, 9, 10, 11, 12, 13, 14, 15, 16, 17, 18, 19, 20, 21, 22, 23, 24, 25, 26, 27, 28, 29, 30, 31, 32, 33, 34, 35, 36, 37, 38, 39, 40, 41, 42, 43, 44, 45, 46, 47, 48, 49, 50

## SMH-125-02-L-D
designator J?
SMT Horizontal Socket, -55 to 125 degC, 2.54 mm Pitch, 50-Pin, Female, RoHS; Manufacturer: Samtec; PartNumber: SMH-125-02-L-D; Pitch: 2.54 mm; DatasheetVersion: F-214; PackageVersion: AF, 2/1999; PackageReference: SMH-125-02-X-D; PackageDescription: .100 [2.54] Horizontal SMT Socket Assembly; Supplier 1: Newark; Supplier Part Number 1: 85T6373; Orientation: Horizontal; RoHS: True; Temperature Range: -55 to 125 degC; Mounting Technology: Surface Mount; ComponentLink1Description: Manufacturer URL; ComponentLink1URL: http://www.samtec.com; ComponentLink2Description: Datasheet; ComponentLink2URL: http://www.samtec.com/documents/webfiles/pdf/SMH.PDF; ComponentLink3Description: Package Specification; ComponentLink3URL: http://www.samtec.com/documents/webfiles/cpdf/SMH-1XX-XX-XX-X-XX-MKT.pdf
footprint SMTC-SMH-125-02-X-D (Horizontal SMT Socket Assembly, 2x25 Pins, 2.54mm Pitch, Female)
pins: 1, 2, 3, 4, 5, 6, 7, 8, 9, 10, 11, 12, 13, 14, 15, 16, 17, 18, 19, 20, 21, 22, 23, 24, 25, 26, 27, 28, 29, 30, 31, 32, 33, 34, 35, 36, 37, 38, 39, 40, 41, 42, 43, 44, 45, 46, 47, 48, 49, 50

## SMH-125-02-T-D
designator J?
SMT Horizontal Socket, -55 to 105 degC, 2.54 mm Pitch, 50-Pin, Female, RoHS; Manufacturer: Samtec; PartNumber: SMH-125-02-T-D; Pitch: 2.54 mm; DatasheetVersion: F-214; PackageVersion: AF, 2/1999; PackageReference: SMH-125-02-X-D; PackageDescription: .100 [2.54] Horizontal SMT Socket Assembly; Supplier 1: Newark; Supplier Part Number 1: 97P8159; Orientation: Horizontal; RoHS: True; Temperature Range: -55 to 105 degC; Mounting Technology: Surface Mount; ComponentLink1Description: Manufacturer URL; ComponentLink1URL: http://www.samtec.com; ComponentLink2Description: Datasheet; ComponentLink2URL: http://www.samtec.com/documents/webfiles/pdf/SMH.PDF; ComponentLink3Description: Package Specification; ComponentLink3URL: http://www.samtec.com/documents/webfiles/cpdf/SMH-1XX-XX-XX-X-XX-MKT.pdf
footprint SMTC-SMH-125-02-X-D (Horizontal SMT Socket Assembly, 2x25 Pins, 2.54mm Pitch, Female)
pins: 1, 2, 3, 4, 5, 6, 7, 8, 9, 10, 11, 12, 13, 14, 15, 16, 17, 18, 19, 20, 21, 22, 23, 24, 25, 26, 27, 28, 29, 30, 31, 32, 33, 34, 35, 36, 37, 38, 39, 40, 41, 42, 43, 44, 45, 46, 47, 48, 49, 50
